# Altium footprint library Selex_PCBLib.PcbLib: 388 footprints (part 11 of 25)
Each footprint in its own frame and in the unit in brackets; x right, y up, seen from the top. Pads: shape width x height; smd on the part's side, far side on the other; paste and mask are expansions set on the pad; w line width, h text height; cw(c..) or ccw(c..) is an arc to the next point about the centre after c.
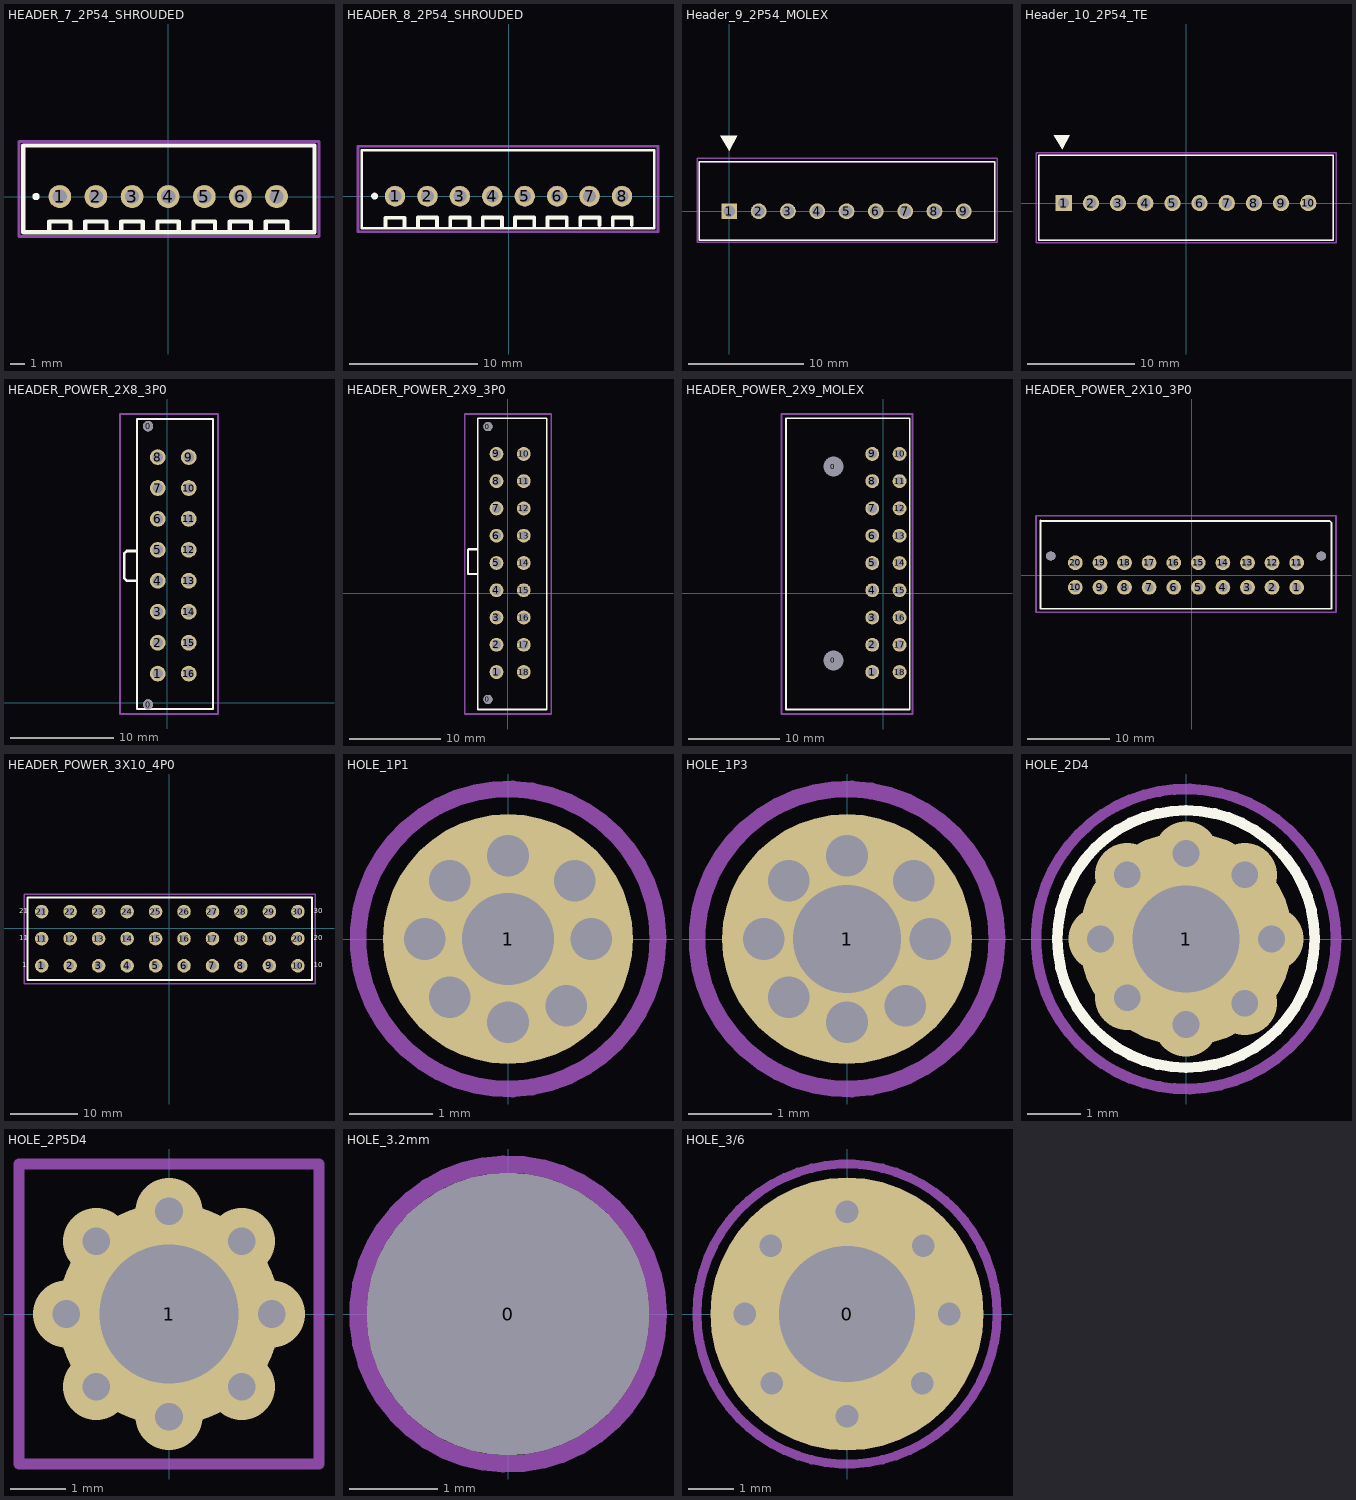
[diagram p10: the footprints below, top view; thin cyan lines are the x and y axes]

## HEADER_7_2P54_SHROUDED [mm]
pads (7):
  round 1.6 hole 1 mask+0.1: 1(-7.63,0.02) 2(-5.09,0.02) 3(-2.55,0.02) 4(-0.01,0.02) 5(2.53,0.02) 6(5.07,0.02) 7(7.61,0.02)
Top Overlay:
  circle w0.254: c-9.3,0.02 r0.128
  lines w0.3: -8.38,-2.49 -8.38,-1.74 -6.88,-1.74 -6.88,-2.49 ; -5.84,-2.49 -5.84,-1.74 -4.34,-1.74 -4.34,-2.49 ; -3.3,-2.49 -3.3,-1.74 -1.8,-1.74 -1.8,-2.49 ; -0.76,-2.49 -0.76,-1.74 0.74,-1.74 0.74,-2.49 ; 1.78,-2.49 1.78,-1.74 3.28,-1.74 3.28,-2.49 ; 4.32,-2.49 4.32,-1.74 5.82,-1.74 5.82,-2.49 ; 6.86,-2.49 6.86,-1.74 8.36,-1.74 8.36,-2.49 ; -10.21,-2.49 10.29,-2.49 10.29,3.606 -10.21,3.606 -10.21,-2.49
Mechanical 1:
  circle w0.05: c7.61,0.02 r0.762
  circle w0.05: c5.07,0.02 r0.762
  circle w0.05: c2.53,0.02 r0.762
  circle w0.05: c-0.01,0.02 r0.762
  circle w0.05: c-2.55,0.02 r0.762
  circle w0.05: c-5.09,0.02 r0.762
  circle w0.05: c-7.63,0.02 r0.762
  lines w0.05: -8.38,-2.49 -8.38,-1.74 -6.88,-1.74 -6.88,-2.49 ; -5.84,-2.49 -5.84,-1.74 -4.34,-1.74 -4.34,-2.49 ; -3.3,-2.49 -3.3,-1.74 -1.8,-1.74 -1.8,-2.49 ; -0.76,-2.49 -0.76,-1.74 0.74,-1.74 0.74,-2.49 ; 1.78,-2.49 1.78,-1.74 3.28,-1.74 3.28,-2.49 ; 4.32,-2.49 4.32,-1.74 5.82,-1.74 5.82,-2.49 ; 6.86,-2.49 6.86,-1.74 8.36,-1.74 8.36,-2.49 ; -10.21,-2.49 -10.21,3.606 10.29,3.606 10.29,-2.49 -10.21,-2.49
  text "6" at 4.8,-0.43 h0.8
  text "4" at -0.27,-0.38 h0.8
  text "3" at -2.77,-0.38 h0.8
  text "2" at -5.35,-0.38 h0.8
  text "1" at -7.75,-0.38 h0.8
  text "5" at 2.33,-0.38 h0.8
  text "7" at 7.43,-0.48 h0.8
Mechanical 15:
  lines w0.2: -10.5,-2.8 10.6,-2.8 10.6,3.9 -10.5,3.9 -10.5,-2.8
3D body "JST7.step": height 7, standoff -3.4, extent -9.92,-2.33 9.98,3.42

## HEADER_8_2P54_SHROUDED [mm]
pads (8):
  round 1.6 hole 1 mask+0.1: 1(-8.9,-0.01) 2(-6.36,-0.01) 3(-3.82,-0.01) 4(-1.28,-0.01) 5(1.26,-0.01) 6(3.8,-0.01) 7(6.34,-0.01) 8(8.88,-0.01)
Top Overlay:
  circle w0.254: c-10.5,-0.01 r0.141
  lines w0.2: -11.51,-2.52 11.39,-2.52 11.39,3.576 -11.51,3.576 -11.51,-2.52
  lines w0.3: -9.65,-2.42 -9.65,-1.7 -8.15,-1.7 -8.15,-2.42 ; -7.11,-2.42 -7.11,-1.67 -5.61,-1.67 -5.61,-2.42 ; -4.57,-2.42 -4.57,-1.67 -3.07,-1.67 -3.07,-2.42 ; -2.03,-2.42 -2.03,-1.67 -0.53,-1.67 -0.53,-2.42 ; 0.51,-2.42 0.51,-1.67 2.01,-1.67 2.01,-2.42 ; 3.05,-2.42 3.05,-1.67 4.55,-1.67 4.55,-2.42 ; 5.61,-2.33 5.61,-1.68 7.11,-1.68 7.11,-2.28 ; 8.15,-2.33 8.15,-1.68 9.65,-1.68 9.65,-2.28
Mechanical 1:
  circle w0.05: c8.88,-0.01 r0.762
  circle w0.05: c6.34,-0.01 r0.762
  circle w0.05: c3.8,-0.01 r0.762
  circle w0.05: c1.26,-0.01 r0.762
  circle w0.05: c-1.28,-0.01 r0.762
  circle w0.05: c-3.82,-0.01 r0.762
  circle w0.05: c-6.36,-0.01 r0.762
  circle w0.05: c-8.9,-0.01 r0.762
  lines w0.05: -9.65,-2.52 -9.65,-1.77 ; -9.65,-1.67 -8.15,-1.67 ; -8.15,-2.52 -8.15,-1.77 ; -7.11,-2.52 -7.11,-1.77 -5.61,-1.77 ; -5.61,-2.42 -5.61,-1.67 ; -4.57,-2.52 -4.57,-1.77 -3.07,-1.77 -3.07,-2.52 ; -2.03,-2.52 -2.03,-1.77 -0.53,-1.77 -0.53,-2.52 ; 0.51,-2.52 0.51,-1.77 2.01,-1.77 2.01,-2.52 ; 3.05,-2.52 3.05,-1.77 4.55,-1.77 4.55,-2.52 ; 5.61,-2.43 5.61,-1.78 7.11,-1.78 7.11,-2.38 ; 8.15,-2.43 8.15,-1.78 9.65,-1.78 9.65,-2.38 ; -11.51,-2.52 -11.51,3.576 11.39,3.576 11.39,-2.52 -11.51,-2.52
  text "8" at 8.59,-0.51 h0.8
  text "6" at 3.53,-0.46 h0.8
  text "4" at -1.54,-0.41 h0.8
  text "3" at -4.04,-0.41 h0.8
  text "2" at -6.62,-0.41 h0.8
  text "1" at -9.02,-0.41 h0.8
  text "5" at 1.06,-0.41 h0.8
  text "7" at 6.16,-0.51 h0.8
Mechanical 15:
  lines w0.2: -11.8,-2.8 11.7,-2.8 11.7,3.9 -11.8,3.9 -11.8,-2.8
3D body "JST8.step": height 7, standoff -3.4, extent -11.24,-2.36 11.16,3.39

## Header_9_2P54_MOLEX [mm]
pads (9):
  rect 1.37x1.37 hole 1.02: 1(0,0)
  round 1.37 hole 1.02: 2(2.54,0) 3(5.08,0) 4(7.62,0) 5(10.16,0) 6(12.7,0) 7(15.24,0) 8(17.78,0) 9(20.32,0)
Top Overlay:
  region: -0.8,6.562 0,5.238 0.7,6.562
  lines w0.127: -2.6,-2.5 23,-2.5 23,4.3 -2.6,4.3 -2.6,-2.5
Mechanical 13:
  lines w0.127: -2.4,-2.5 22.6,-2.5 ; -2.6,-2.5 23,-2.5 23,4.3 -2.6,4.3 -2.6,-2.5
Mechanical 15:
  lines w0.127: -2.8,-2.7 23.2,-2.7 23.2,4.6 -2.8,4.6 -2.8,-2.7
3D body "h9.stp": height 12.81, standoff -2.3, extent -2.5,-2.4 22.9,4.204

## Header_10_2P54_TE [mil]
pads (10):
  rect 60x60 hole 40: 1(-450,0)
  round 60 hole 40: 2(-350,0) 3(-250,0) 4(-150,0) 5(-50,0) 6(50,0) 7(150,0) 8(250,0) 9(350,0) 10(450,0)
Top Overlay:
  region: -486.22,250.47 -454.72,198.35 -427.17,250.47
  lines w5: -542.01,-137.01 542.01,-137.01 542.01,175.98 -542.01,175.98 -542.01,-137.01
Mechanical 13:
  lines w5: -542.01,-137.01 542.01,-137.01 542.01,175.98 -542.01,175.98 -542.01,-137.01
Mechanical 15:
  lines w5: -551.85,-146.85 551.85,-146.85 551.85,185.83 -551.85,185.83 -551.85,-146.85
3D body "header10.x_t": height 393.7, standoff -156.3, extent -541.99,-132.87 542.01,180.13

## HEADER_POWER_2X8_3P0 [mil]
pads (18):
  round 39.37 hole 39.37: 0(-74.01,-7.11) 0(-74.01,1055.88)
  round 60 hole 39.37: 1(-37,111) 2(-37,229.11) 3(-37,347.22) 4(-37,465.33) 5(-37,583.44) 6(-37,701.55) 7(-37,819.66) 8(-37,937.77) 9(81.11,937.77) 10(81.11,819.66) 11(81.11,701.55) 12(81.11,583.44) 13(81.11,465.33) 14(81.11,347.22) 15(81.11,229.11) 16(81.11,111)
Top Overlay:
  lines w7.87: -117,-24 173.16,-24 173.16,1084 -117,1084 -117,-24
  lines w10: -118,579 -155,579 -165,569 -165,476 -154,465 -117,465
Mechanical 15:
  lines w7.87: -181.1,-43.31 -181.1,1102.36 192.91,1102.36 192.91,-43.31 -181.1,-43.31
3D body "430451624.stp": height 391.93, standoff -123.43, extent -167.16,-21.13 178.11,1087.14

## HEADER_POWER_2X9_3P0 [mil]
pads (20):
  round 39.37 hole 39.37: 0(-85.01,-460.11) 0(-85.01,720.99)
  round 60 hole 39.37: 1(-48,-342) 2(-48,-223.89) 3(-48,-105.78) 4(-48,12.33) 5(-48,130.44) 6(-48,248.55) 7(-48,366.66) 8(-48,484.77) 9(-48,602.88) 10(70.11,602.88) 11(70.11,484.77) 12(70.11,366.66) 13(70.11,248.55) 14(70.11,130.44) 15(70.11,12.33) 16(70.11,-105.78) 17(70.11,-223.89) 18(70.11,-342)
Top Overlay:
  lines w7.87: -129,-504 -129,757 170,757 170,-504 -129,-504
  lines w10: -132,190 -168,190 -171,187 -171,83 -131,83
Mechanical 15:
  lines w7.87: -185.04,-523.62 -185.04,775.59 188.98,775.59 188.98,-523.62 -185.04,-523.62
3D body "430451824.stp": height 391.93, standoff -123.43, extent -172.16,-486.18 173.12,740.2

## HEADER_POWER_2X9_MOLEX [mil]
pads (20):
  round 39.37 hole 86.61: 0(-216.54,-291.34) 0(-216.54,547.24)
  round 60 hole 39.37: 1(-48,-342) 2(-48,-223.89) 3(-48,-105.78) 4(-48,12.33) 5(-48,130.44) 6(-48,248.55) 7(-48,366.66) 8(-48,484.77) 9(-48,602.88) 10(70.11,602.88) 11(70.11,484.77) 12(70.11,366.66) 13(70.11,248.55) 14(70.11,130.44) 15(70.11,12.33) 16(70.11,-105.78) 17(70.11,-223.89) 18(70.11,-342)
Top Overlay:
  lines w7.87: -421.26,-504 114.17,-504 114.17,757 -421.26,757 -421.26,-504
Mechanical 15:
  lines w7.87: -440.94,-523.62 125.98,-523.62 125.98,775.59 -440.94,775.59 -440.94,-523.62
3D body "430451800.stp": height 387.01, standoff -83.46, extent -398.43,-484.25 83.46,742.13

## HEADER_POWER_2X10_3P0 [mm]
pads (20):
  round 1.8 hole 1.1: 1(12.8,-1.45) 2(9.8,-1.45) 3(6.8,-1.45) 4(3.8,-1.45) 5(0.8,-1.45) 6(-2.2,-1.45) 7(-5.2,-1.45) 8(-8.2,-1.45) 9(-11.2,-1.45) 10(-14.2,-1.45) 11(12.8,1.55) 12(9.8,1.55) 13(6.8,1.55) 14(3.8,1.55) 15(0.8,1.55) 16(-2.2,1.55) 17(-5.2,1.55) 18(-8.2,1.55) 19(-11.2,1.55) 20(-14.2,1.55)
via -17.2,2.4 diameter 1.1 hole 1.1
via 15.8,2.4 diameter 1.1 hole 1.1
Top Overlay:
  lines w0.2: -18.45,6.65 -0.7,6.65 16.85,6.65 17.05,6.45 17.05,0.7 ; -18.45,6.7 -18.45,-0.55 -18.45,-4.05 -0.7,-4.05 17.05,-4.05 17.05,-0.3
  lines w0.21: 17.05,-0.3 17.05,0.7
Mechanical 15:
  lines w0.2: -19,-4.5 17.6,-4.5 17.6,7.3 -19,7.3 -19,-4.5
3D body "430452012.stp": height 9.95, standoff -3.14, extent -17.775,-3.89 16.375,4.88
3D body "430252000.stp": height 17.6, standoff 3.6, extent -16.12,-4.08 14.73,6.75

## HEADER_POWER_2X10_3P96 [mm]

## HEADER_POWER_3X10_4P0 [mm]
pads (30):
  round 2 hole 1.2: 1(-18.85,-5.55) 2(-14.65,-5.55) 3(-10.45,-5.55) 4(-6.25,-5.55) 5(-2.05,-5.55) 6(2.15,-5.55) 7(6.35,-5.55) 8(10.55,-5.55) 9(14.75,-5.55) 10(18.95,-5.55) 11(-18.85,-1.55) 12(-14.65,-1.55) 13(-10.45,-1.55) 14(-6.25,-1.55) 15(-2.05,-1.55) 16(2.15,-1.55) 17(6.35,-1.55) 18(10.55,-1.55) 19(14.75,-1.55) 20(18.95,-1.55) 21(-18.85,2.45) 22(-14.65,2.45) 23(-10.45,2.45) 24(-6.25,2.45) 25(-2.05,2.45) 26(2.15,2.45) 27(6.35,2.45) 28(10.55,2.45) 29(14.75,2.45) 30(18.95,2.45)
Top Overlay:
  lines w0.3: -20.95,-7.65 -20.95,-1.55 -20.95,4.55 0.05,4.55 21.05,4.55 21.05,-2.05 21.05,-7.65 0.05,-7.65 -20.95,-7.65
  text "21" at -22.196,2.204 h0.76
  text "30" at 21.304,2.204 h0.76
  text "20" at 21.304,-1.796 h0.76
  text "11" at -22.196,-1.796 h0.76
  text "10" at 21.304,-5.796 h0.76
  text "1" at -21.696,-5.796 h0.76
Mechanical 15:
  lines w0.2: -21.4,-8.2 -21.4,5 21.5,5 21.5,-8.2 -21.4,-8.2
3D body: height 17, standoff 0, extent -20.95,-7.65 21.05,4.55

## HOLE_1P1 [mm]
pads (1):
  round 3 hole 1.1: 1(0,0)
via 0,1 diameter 0.5 hole 0.5
via 0.8,0.7 diameter 0.5 hole 0.5
via 1,0 diameter 0.5 hole 0.5
via 0.7,-0.8 diameter 0.5 hole 0.5
via 0,-1 diameter 0.5 hole 0.5
via -0.7,-0.7 diameter 0.5 hole 0.5
via -1,0 diameter 0.5 hole 0.5
via -0.7,0.7 diameter 0.5 hole 0.5
Mechanical 15:
  circle w0.2: c0,0 r1.8

## HOLE_1P3 [mm]
pads (1):
  round 3 hole 1.3: 1(0,0)
via -0.7,0.7 diameter 0.5 hole 0.5
via -1,0 diameter 0.5 hole 0.5
via -0.7,-0.7 diameter 0.5 hole 0.5
via 0,-1 diameter 0.5 hole 0.5
via 0.7,-0.8 diameter 0.5 hole 0.5
via 1,0 diameter 0.5 hole 0.5
via 0.8,0.7 diameter 0.5 hole 0.5
via 0,1 diameter 0.5 hole 0.5
Mechanical 15:
  circle w0.2: c0,0 r1.8

## HOLE_2D4 [mm]
pads (1):
  round 4 hole 2: 1(0,0)
via 0,1.6 diameter 1.2 hole 0.5
via 1.1,1.2 diameter 1.2 hole 0.5
via 1.6,0 diameter 1.2 hole 0.5
via 1.1,-1.2 diameter 1.2 hole 0.5
via 0,-1.6 diameter 1.2 hole 0.5
via -1.1,-1.1 diameter 1.2 hole 0.5
via -1.6,0 diameter 1.2 hole 0.5
via -1.1,1.2 diameter 1.2 hole 0.5
Top Overlay:
  circle w0.2: c0,0 r2.408
Mechanical 15:
  circle w0.2: c0,0 r2.807

## HOLE_2P5D4 [mm]
pads (1):
  round 4 hole 2.5: 1(0,0)
via -1.308,1.308 diameter 1.2 hole 0.5
via 1.308,1.308 diameter 1.2 hole 0.5
via 1.85,0 diameter 1.2 hole 0.5
via 1.308,-1.308 diameter 1.2 hole 0.5
via 0,-1.85 diameter 1.2 hole 0.5
via -1.308,-1.308 diameter 1.2 hole 0.5
via -1.85,0 diameter 1.2 hole 0.5
via 0,1.85 diameter 1.2 hole 0.5
Mechanical 15:
  lines w0.2: -2.7,-2.7 -2.7,2.7 2.7,2.7 2.7,-2.7 -2.7,-2.7

## HOLE_3.2mm [mm]
pads (1):
  round 3.2 hole 3.2 mask+0.075: 0(0,0)
Mechanical 15:
  circle w0.2: c0,0 r1.7

## HOLE_3/6 [mm]
pads (1):
  round 6 hole 3 mask+0.075: 0(0,0)
via -2.25,0 diameter 1 hole 0.5
via 2.25,0 diameter 1 hole 0.5
via 0,-2.25 diameter 1 hole 0.5
via 0,2.25 diameter 1 hole 0.5
via -1.675,1.502 diameter 1 hole 0.5
via -1.656,-1.523 diameter 1 hole 0.5
via 1.675,1.502 diameter 1 hole 0.5
via 1.656,-1.523 diameter 1 hole 0.5
Mechanical 15:
  circle w0.2: c0,0 r3.298